# Altium footprint library MH_DA_THU_VIEN_16122016.PcbLib: 531 footprints (part 11 of 34)
Each footprint in its own frame and in the unit in brackets; x right, y up, seen from the top. Pads: shape width x height; smd on the part's side, far side on the other; paste and mask are expansions set on the pad; w line width, h text height; cw(c..) or ccw(c..) is an arc to the next point about the centre after c.
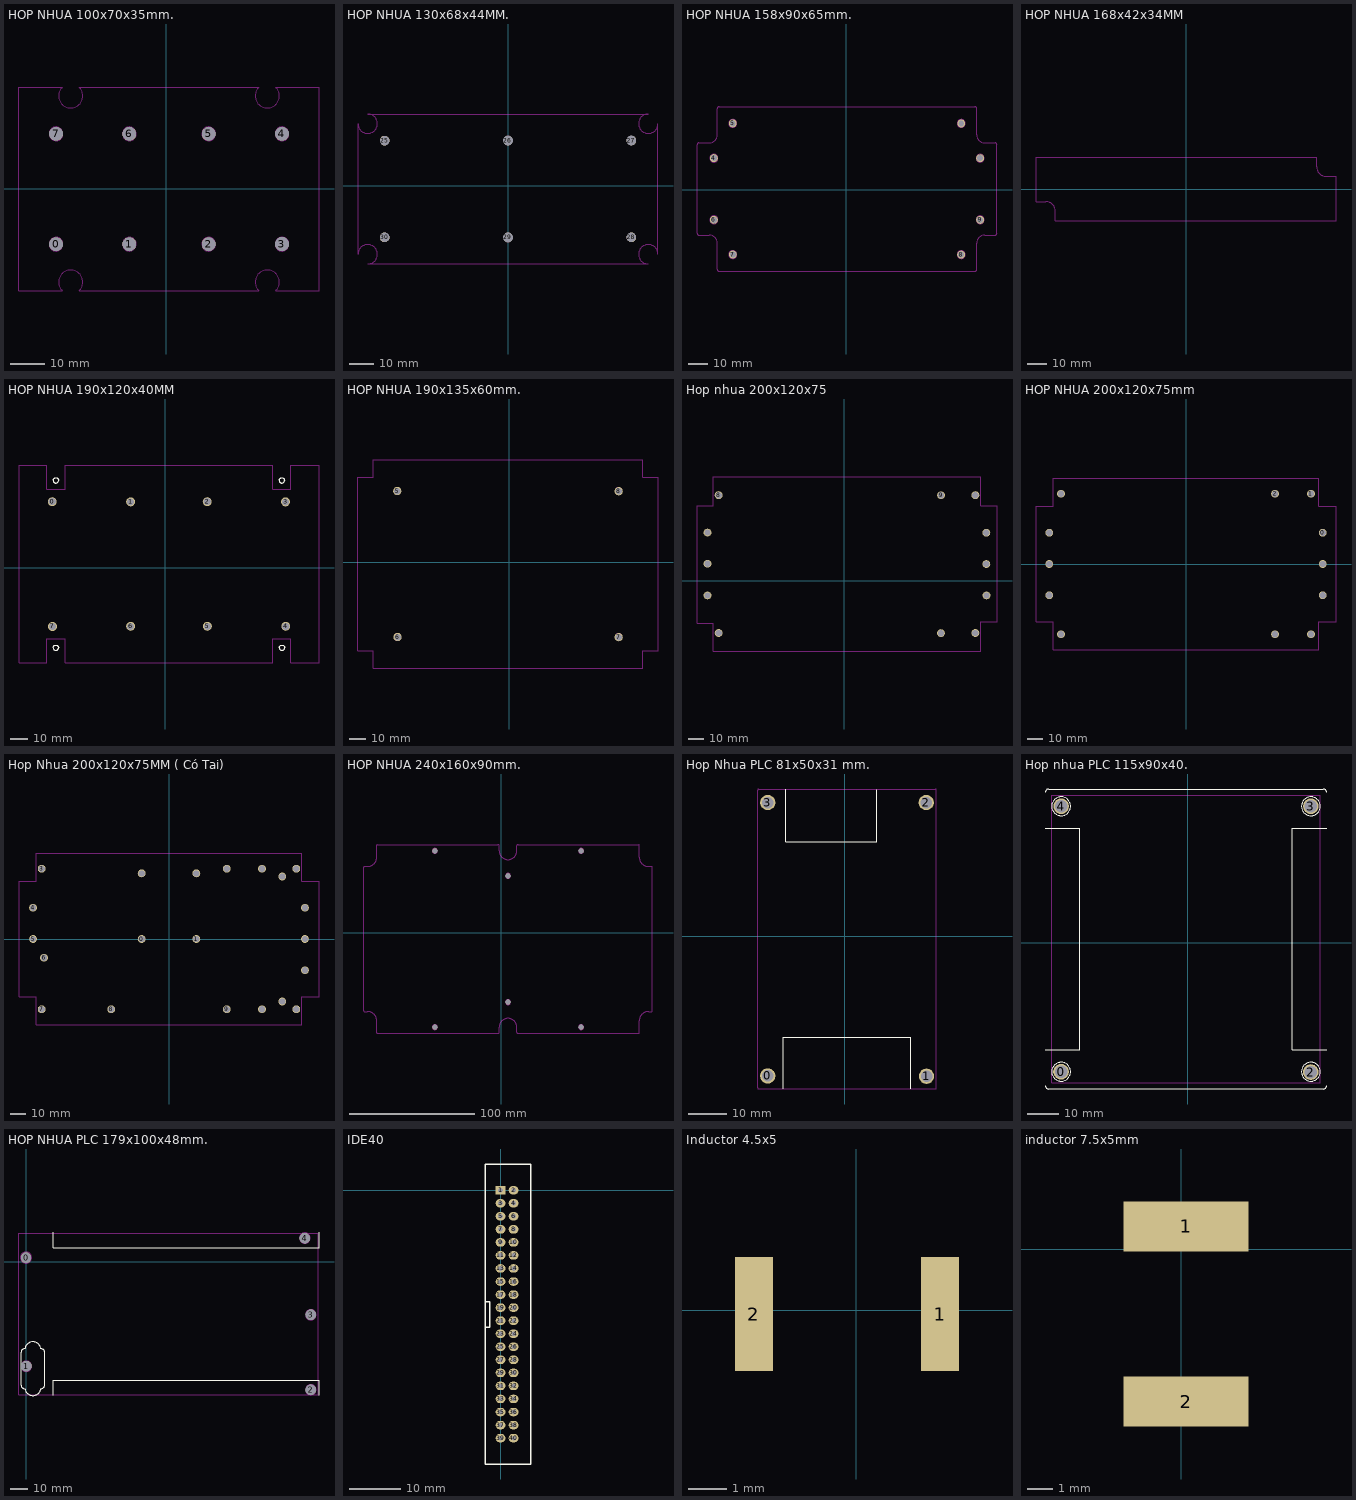
[diagram p10: the footprints below, top view; thin cyan lines are the x and y axes]

## HOP NHUA 100x70x35mm. [mm]
pads (8):
  round 4 hole 4: 0(-31.979,-16.129) 1(-10.719,-16.129) 2(12.294,-16.129) 3(33.553,-16.104) 4(33.553,15.875) 5(12.294,15.875) 6(-10.719,15.875) 7(-31.953,15.875)
Keep-Out Layer:
  circle w0.254: c-31.961,15.881 r2
  circle w0.254: c-10.711,15.881 r2
  circle w0.254: c12.289,15.881 r2
  circle w0.254: c33.539,15.881 r2
  circle w0.254: c33.539,-16.119 r2
  circle w0.254: c12.289,-16.119 r2
  circle w0.254: c-10.711,-16.119 r2
  circle w0.254: c-31.961,-16.119 r2
  lines w0.254: -42.711,-29.619 -42.711,29.381 -30.16,29.381 ccw(c-27.711,26.881) -25.261,29.381 26.84,29.381 ccw(c29.289,26.881) 31.739,29.381 44.289,29.381 44.289,-29.619 31.739,-29.619 ccw(c29.289,-27.119) 26.84,-29.619 -25.261,-29.619 ccw(c-27.711,-27.119) -30.16,-29.619 -42.711,-29.619

## HOP NHUA 130x68x44MM. [mm]
pads (6):
  round 4 hole 4: 25(-51.181,18.745) 26(-0.203,18.771) 27(50.8,18.771) 28(50.775,-21.234) 29(-0.203,-21.26) 30(-51.206,-21.234)
Keep-Out Layer:
  circle w0.254: c-51.201,18.752 r1.5
  circle w0.254: c-0.201,18.752 r1.5
  circle w0.254: c50.799,18.752 r1.5
  circle w0.254: c-51.201,-21.248 r1.5
  circle w0.254: c-0.201,-21.248 r1.5
  circle w0.254: c50.799,-21.248 r1.5
  lines w0.254: -62.201,-28.248 cw(c-58.201,-28.248) -58.201,-32.248 57.799,-32.248 cw(c57.799,-28.248) 61.799,-28.248 61.799,25.752 cw(c57.799,25.752) 57.799,29.752 -58.201,29.752 cw(c-58.201,25.752) -62.201,25.752 -62.201,-28.248

## HOP NHUA 158x90x65mm. [mm]
pads (8):
  round 4 hole 3: 4(-66.599,16.002) 5(-57.099,33.503) 6(-66.599,-15.011) 7(-57.074,-32.512) 8(57.861,-32.537) 9(67.437,-15.037) 10(67.437,15.977) 11(57.912,33.477)
Keep-Out Layer:
  circle w0.254: c-57.087,33.483 r2
  circle w0.254: c-66.587,15.983 r2
  circle w0.254: c-57.087,-32.517 r2
  circle w0.254: c-66.587,-15.017 r2
  circle w0.254: c57.913,33.483 r2
  circle w0.254: c67.413,15.983 r2
  circle w0.254: c57.913,-32.517 r2
  circle w0.254: c67.413,-15.017 r2
  lines w0.254: -75.087,-21.767 ccw(c-74.087,-21.767) -74.087,-22.767 -68.837,-22.767 cw(c-68.837,-26.767) -64.837,-26.767 -64.837,-40.017 ccw(c-63.837,-40.017) -63.837,-41.017 64.663,-41.017 ccw(c64.663,-40.017) 65.663,-40.017 65.663,-26.767 cw(c69.663,-26.767) 69.663,-22.767 74.913,-22.767 ccw(c74.913,-21.767) 75.913,-21.767 75.913,22.733 ccw(c74.913,22.733) 74.913,23.733 69.663,23.733 cw(c69.663,27.733) 65.663,27.733 65.663,40.983 ccw(c64.663,40.983) 64.663,41.983 -63.837,41.983 ccw(c-63.837,40.983) -64.837,40.983 -64.837,27.733 cw(c-68.837,27.733) -68.837,23.733 -74.087,23.733 ccw(c-74.087,22.733) -75.087,22.733 -75.087,-21.767

## HOP NHUA 168x42x34MM [mm]
Keep-Out Layer:
  lines w0.254: -77.5,-6.5 -77.5,16.5 67.5,16.5 67.5,11.5 ccw(c72.5,11.5) 72.5,6.5 77.5,6.5 77.5,-16.5 -67.5,-16.5 -67.5,-11.5 ccw(c-72.5,-11.5) -72.5,-6.5 -77.5,-6.5

## HOP NHUA 190x120x40MM [mm]
pads (8):
  round 5 hole 4: 0(-63.491,37.237) 1(-19.491,37.137) 2(23.509,37.237) 3(67.509,37.137) 4(67.609,-32.763) 5(23.609,-32.763) 6(-19.491,-32.763) 7(-63.391,-32.863)
Top Overlay:
  drawing of 400 lines, arcs and shapes, not listed
Keep-Out Layer:
  lines w0.254: -82.191,-53.263 -82.191,57.737 -66.691,57.737 -66.691,44.237 -56.191,44.237 -56.191,57.737 60.309,57.737 60.309,44.237 70.309,44.237 70.309,57.737 86.309,57.737 86.309,-53.263 70.309,-53.263 70.309,-39.763 60.309,-39.763 60.309,-53.263 -56.191,-53.263 -56.191,-39.763 -66.691,-39.763 -66.691,-53.263 -82.191,-53.263

## HOP NHUA 190x135x60mm. [mm]
pads (4):
  round 5 hole 4: 5(-68.174,43.536) 6(-68.021,-45.517) 7(66.878,-45.593) 8(66.878,43.434)
Keep-Out Layer:
  circle w0.254: c-68.135,43.533 r2
  circle w0.254: c66.865,43.533 r2
  circle w0.254: c-68.135,-45.467 r2
  circle w0.254: c66.865,-45.467 r2
  lines w0.254: -84.973,-53.776 -92.135,-53.776 ; -82.734,-57.589 -82.734,-64.467 ; -92.135,-53.776 -92.135,51.843 -82.734,51.843 -82.734,62.533 81.463,62.533 81.463,51.843 90.865,51.843 90.865,-53.776 81.463,-53.776 81.463,-64.467 -82.734,-64.467 ; -92.135,-53.776 -82.734,-53.776 -82.734,-64.467

## Hop nhua 200x120x75 [mm]
pads (12):
  round 5 hole 4: 8(-80.2,54.7) 9(61.8,54.6) 10(83.7,54.7) 11(90.7,30.7) 12(90.7,10.7) 13(90.8,-9.3) 14(83.7,-33.3) 15(61.7,-33.4) 16(-80.2,-33.3) 17(-87.3,-9.3) 18(-87.3,10.9) 19(-87.3,30.8)
Keep-Out Layer:
  lines w0.254: -94,-27 -83.5,-27 -83.5,-45 87,-45 87,-26 97.5,-26 97.5,48 87,48 87,66.5 -83.5,66.5 -83.5,48 -94,48 -94,-27

## HOP NHUA 200x120x75mm [mm]
pads (12):
  round 5 hole 4: 0(87.5,20) 1(80,45) 2(57,45) 23(-87.5,0) 24(87.5,0) 26(-87.5,20) 27(-80,45) 28(-87.5,-20) 29(-80,-45) 30(57,-45) 31(80,-45) 32(87.5,-20)
Keep-Out Layer:
  lines w0.254: -96,-37 -96,37 -85,37 -85,55 85,55 85,37 96,37 96,-37 85,-37 85,-55 -85,-55 -85,-37 -96,-37

## Hop Nhua 200x120x75MM ( Có Tai) [mm]
pads (21):
  round 5 hole 4: 0(-17.5,0) 1(17.5,0) 3(-81.5,45) 4(-87,20) 5(-87,0) 6(-80,-12) 7(-81.5,-45) 8(-37,-45) 9(37,-45) 10(59.5,-45) 11(72.5,-40) 12(81.5,-45) 13(87,-20) 14(87,0) 15(87,20) 16(81.5,45) 17(72.5,40) 19(59.5,45) 20(37,45) 21(17.5,42) 22(-17.5,42)
Keep-Out Layer:
  lines w0.254: -96,-37 -85,-37 -85,-55 85,-55 85,-37 96,-37 96,37 85,37 85,55 -85,55 -85,37 -96,37 -96,-37

## HOP NHUA 240x160x90mm. [mm]
pads (6):
  round 4 hole 4: 19(-53.238,65.557) 20(5.258,45.568) 21(63.754,65.557) 22(63.754,-75.438) 23(5.258,-55.423) 24(-53.238,-75.438)
Keep-Out Layer:
  circle w0.254: c5.252,45.566 r2
  circle w0.254: c5.252,-55.434 r2
  circle w0.254: c-53.248,65.566 r2
  circle w0.254: c63.752,65.566 r2
  circle w0.254: c-53.248,-75.434 r2
  circle w0.254: c63.752,-75.434 r2
  lines w0.254: -110.248,-62.434 ccw(c-109.748,-62.434) -109.748,-62.934 -107.248,-62.934 cw(c-107.248,-70.434) -99.748,-70.434 -99.748,-79.934 ccw(c-99.248,-79.934) -99.248,-80.434 -2.748,-80.434 ccw(c-2.748,-79.434) -1.748,-79.434 -1.748,-75.434 cw(c5.252,-75.434) 12.252,-75.434 12.252,-79.434 ccw(c13.252,-79.434) 13.252,-80.434 109.752,-80.434 ccw(c109.752,-79.934) 110.252,-79.934 110.252,-70.434 cw(c117.752,-70.434) 117.752,-62.934 120.252,-62.934 ccw(c120.252,-62.434) 120.752,-62.434 120.752,52.566 ccw(c120.252,52.566) 120.252,53.066 117.752,53.066 cw(c117.752,60.566) 110.252,60.566 110.252,70.066 ccw(c109.752,70.066) 109.752,70.566 13.252,70.566 ccw(c13.252,69.566) 12.252,69.566 12.252,65.566 cw(c5.252,65.566) -1.748,65.566 -1.748,69.566 ccw(c-2.748,69.566) -2.748,70.566 -99.248,70.566 ccw(c-99.248,70.066) -99.748,70.066 -99.748,60.566 cw(c-107.248,60.566) -107.248,53.066 -109.748,53.066 ccw(c-109.748,52.566) -110.248,52.566 -110.248,-62.434

## Hop Nhua PLC 81x50x31 mm. [mm]
pads (4):
  round 4 hole 3: 0(-20.142,-36.474) 1(21.311,-36.551) 2(21.234,34.874) 3(-20.117,34.874)
Top Overlay:
  lines w0.254: -16.037,-39.889 -16.037,-39.689 -16.037,-26.389 17.153,-26.389 17.153,-39.689 17.153,-39.802 ; -15.442,38.303 -15.442,38.211 -15.442,24.611 8.358,24.611 8.358,38.211 8.358,38.278
Keep-Out Layer:
  circle w0.254: c-20.222,34.861 r1.5
  circle w0.254: c21.338,34.861 r1.5
  circle w0.254: c-20.222,-36.339 r1.5
  circle w0.254: c21.338,-36.339 r1.5
  lines w0.254: -22.742,-39.589 ccw(c-22.442,-39.589) -22.442,-39.889 23.558,-39.889 ccw(c23.558,-39.589) 23.858,-39.589 23.858,38.111 ccw(c23.558,38.111) 23.558,38.411 -22.442,38.411 ccw(c-22.442,38.111) -22.742,38.111 -22.742,-39.589

## Hop nhua PLC 115x90x40. [mm]
pads (4):
  round 5 hole 4: 0(-40.361,-41.072) 2(39.141,-41.199) 3(39.167,43.434) 4(-40.335,43.409)
Top Overlay:
  circle w0.254: c39.17,-41.084 r3
  circle w0.254: c-40.33,-41.084 r3
  circle w0.254: c39.17,43.416 r3
  circle w0.254: c-40.33,43.416 r3
  lines w0.254: -45.33,-45.585 ccw(c-44.33,-45.585) -44.33,-46.585 43.17,-46.584 ccw(c43.17,-45.585) 44.17,-45.585 ; -45.33,-34.085 -44.33,-34.085 -34.33,-34.085 -34.33,36.415 -44.33,36.415 -45.33,36.415 ; -45.33,47.915 cw(c-44.33,47.915) -44.33,48.916 43.17,48.916 cw(c43.17,47.915) 44.17,47.915 ; 44.17,-34.085 43.17,-34.085 33.17,-34.085 33.17,36.415 43.17,36.415 44.17,36.415
Keep-Out Layer:
  lines w0.254: -43.33,-44.585 -43.33,46.915 42.17,46.915 42.17,-44.585 -43.33,-44.585

## HOP NHUA PLC 179x100x48mm. [mm]
pads (5):
  round 6 hole 6: 0(0,2.5) 1(0.228,-59.639) 2(163.144,-73.279) 3(163.22,-30.277) 4(159.791,13.665)
Top Overlay:
  lines w0.006: -0.813,-72.577 cw(c-0.813,-70.577) -2.813,-70.577 -2.813,-51.777 cw(c-0.813,-51.777) -0.813,-49.777 ; -0.58,-72.577 ccw(c3.937,-72.027) 8.453,-72.577 ; -0.58,-49.777 cw(c3.937,-50.327) 8.453,-49.777 ; 8.687,-72.577 ccw(c8.687,-70.577) 10.687,-70.577 10.687,-51.777 ccw(c8.687,-51.777) 8.687,-49.777 ; 15.687,-76.477 15.687,-67.777 167.887,-67.777 167.887,-76.477 ; 15.687,16.923 15.687,8.223 167.887,8.223 167.887,16.923
Keep-Out Layer:
  circle w0.254: c0,2.5 r3.202
  circle w0.006: c163.187,-73.277 r3
  circle w0.006: c163.187,-30.277 r3
  circle w0.006: c159.787,13.723 r3
  circle w0.006: c0.187,-59.777 r3
  lines w0.006: -4.013,-75.977 -4.013,-72.577 -4.013,16.423 167.387,16.423 167.387,-75.977 -4.013,-75.977

## IDE40 [mil]
pads (40):
  rect 75x65 hole 35: 1(0,0)
  oval 75x65 hole 35: 2(100,0) 3(0,-100) 4(100,-100) 5(0,-200) 6(100,-200) 7(0,-300) 8(100,-300) 9(0,-400) 10(100,-400) 11(0,-500) 12(100,-500) 13(0,-600) 14(100,-600) 15(0,-700) 16(100,-700) 17(0,-800) 18(100,-800) 19(0,-900) 20(100,-900) 21(0,-1000) 22(100,-1000) 23(0,-1100) 24(100,-1100) 25(0,-1200) 26(100,-1200) 27(0,-1300) 28(100,-1300) 29(0,-1400) 30(100,-1400) 31(0,-1500) 32(100,-1500) 33(0,-1600) 34(100,-1600) 35(0,-1700) 36(100,-1700) 37(0,-1800) 38(100,-1800) 39(0,-1900) 40(100,-1900)
Top Overlay:
  lines w10: -116.93,-1009.84 -116.93,-1049.61 -82.68,-1049.61 -82.68,-854.33 -116.14,-854.33 ; -116.93,-2098.43 231.5,-2098.43 231.5,200.79 -116.93,200.79 -116.93,-2098.43
3D body: height 351.02, standoff -137.17, extent -116.93,-2098.43 231.49,200.79

## Inductor 4.5x5 [mm]
pads (2):
  rect 1x3 smd: 1(2.2,-0.1) 2(-2.7,-0.1)
3D body: height 2, standoff 0, extent -2.6,-2.6 2.2,2.2

## inductor 7.5x5mm [mm]
pads (2):
  rect 5x2 smd: 1(0.2,0.9) 2(0.2,-6.1)
3D body: height 5, standoff -0.01, extent -3.3,-6.368 3.7,1.368